# Altium footprint library Atlan.PcbLib: 283 footprints (part 13 of 18)
Each footprint in its own frame and in the unit in brackets; x right, y up, seen from the top. Pads: shape width x height; smd on the part's side, far side on the other; paste and mask are expansions set on the pad; w line width, h text height; cw(c..) or ccw(c..) is an arc to the next point about the centre after c.
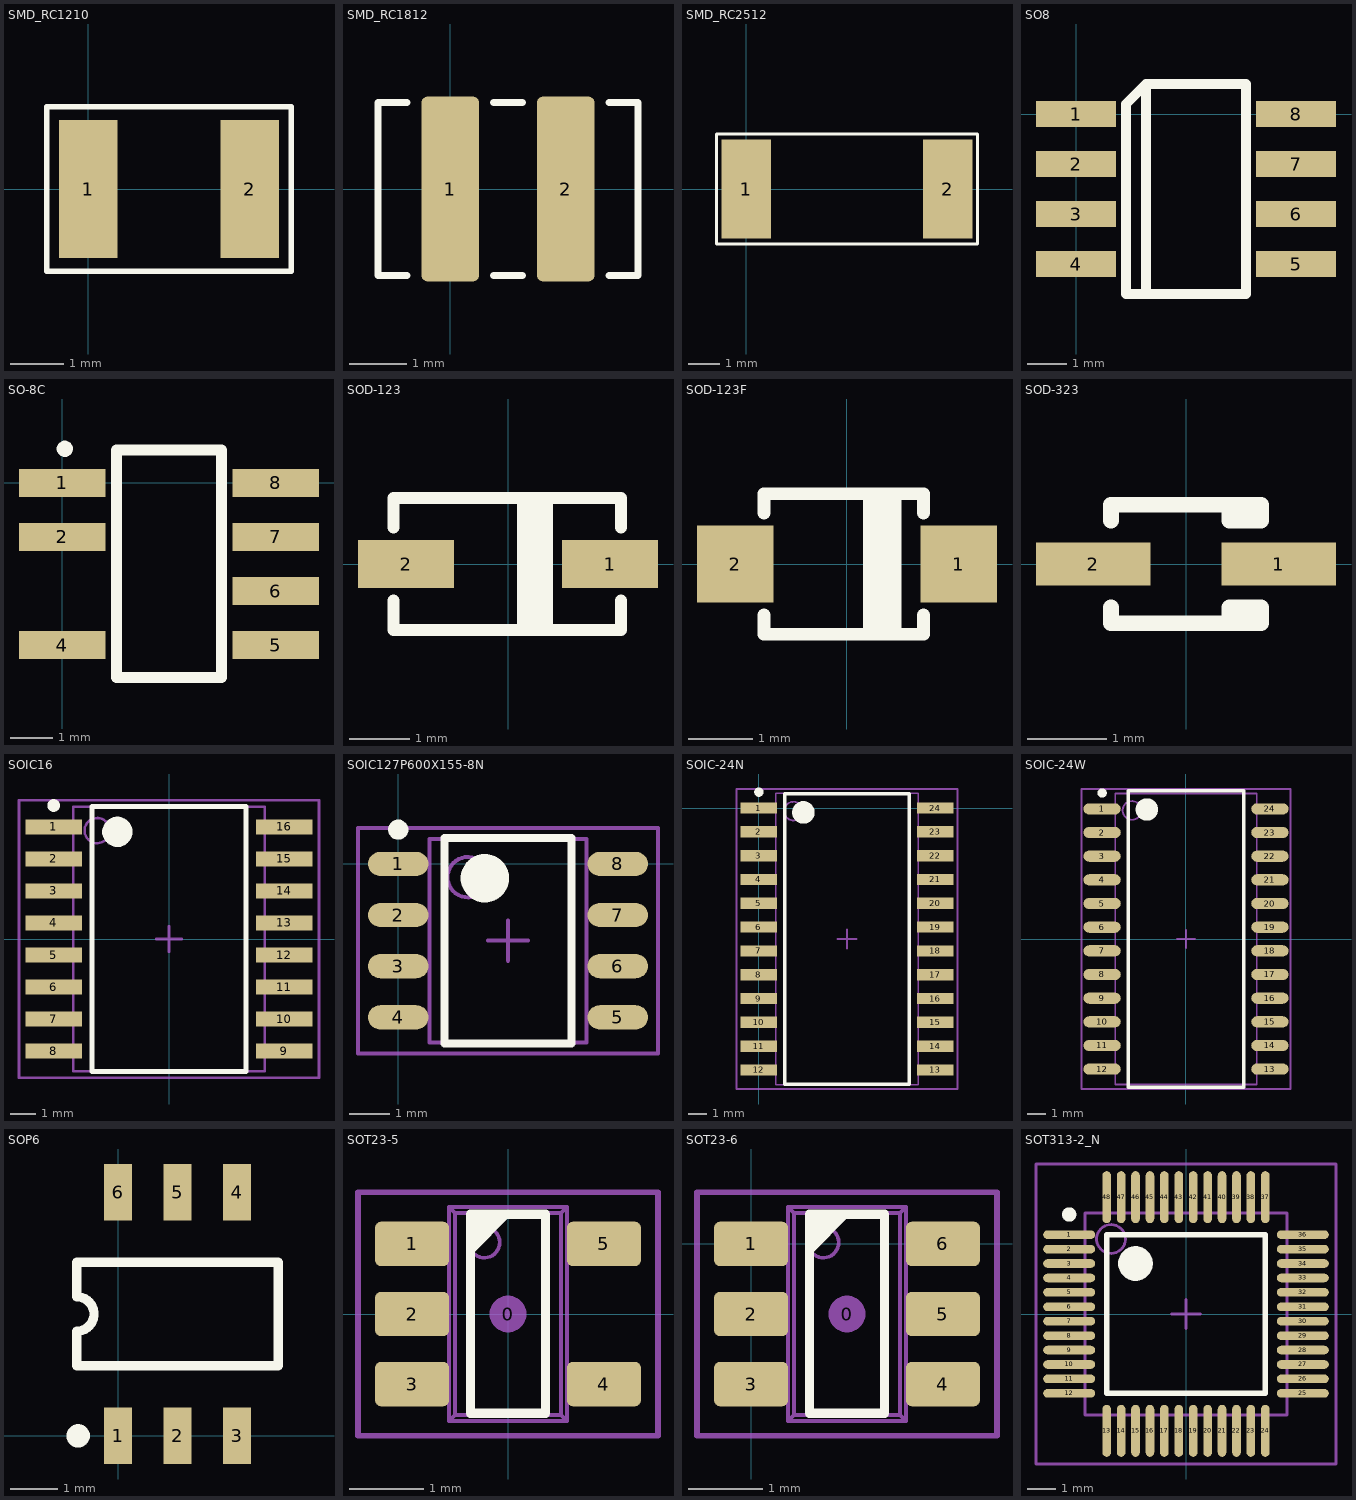
[diagram p12: the footprints below, top view; thin cyan lines are the x and y axes]

## SMD_RC1210 [mm]
pads (2):
  rect 1.1x2.6 smd: 1(0,0) 2(3.048,0)
Top Overlay:
  lines w0.1: -0.776,-1.55 -0.776,1.55 3.824,1.55 3.824,-1.55 -0.776,-1.55
3D body "CC 1210.STEP": height 1.78, standoff 0, extent 0,-1.275 3.048,1.265

## SMD_RC1812 [mm]
pads (2):
  rrect20% 1x3.2 smd: 1(0,0) 2(2,0)
Top Overlay:
  lines w0.12: -0.75,-1.5 -1.25,-1.5 -1.25,1.5 -0.75,1.5 ; 0.75,-1.5 1.25,-1.5 ; 0.75,1.5 1.25,1.5 ; 2.75,-1.5 3.25,-1.5 3.25,1.5 2.75,1.5
3D body: height 2.6, standoff 0, extent -1.25,-1.5 3.25,1.5

## SMD_RC2512 [mm]
pads (2):
  rect 1.6x3.2 smd: 1(0,0) 2(6.5,0)
Top Overlay:
  lines w0.1: -0.975,-1.775 7.475,-1.775 7.475,1.775 -0.975,1.775 -0.975,-1.775
3D body "User Library-RESC6432X06.STEP": height 0.6, standoff 0, extent 0.05,-1.6 6.45,1.6

## SO8 [mil]
pads (8):
  rect 80x26 smd: 1(0,0) 2(0,-50) 3(0,-100) 4(0,-150) 5(220,-150) 6(220,-100) 7(220,-50) 8(220,0)
Top Overlay:
  lines w10: 70,-180 70,30 ; 70,30 50,10 50,-180 170,-180 170,10 170,30 70,30
3D body "SO-8.step": height 64.96, standoff -0.98, extent -8.78,-171.26 229.25,21.65

## SO-8C [mil]
pads (7):
  rect 80x26 smd: 1(0,0) 2(0,-50) 4(0,-150) 5(197.36,-150) 6(197.36,-100) 7(197.36,-50) 8(197.36,0)
Top Overlay:
  lines w7.87: 5.77,32.47 ccw(c2.36,31.5) 5.91,31.5
  lines w10: 50.2,-180 147.36,-180 147.36,10 147.36,30.51 50.2,30.51 50.2,-180
3D body "SO-8.step": height 64.96, standoff -0.98, extent -21.65,-171.26 216.37,21.65

## SOD-123 [mm] "SOD-123; 2 Leads; Body 2.7 x 1.6 mm, (LxW)"
height 1.35
pads (2):
  rect 1.6x0.8 smd: 1(1.7,0) 2(-1.7,0)
Top Overlay:
  rectangle: 0.15,-1.1 0.75,1.1
  lines w0.2: -1.905,-0.61 -1.905,-1.1 1.88,-1.1 1.88,-0.61 ; -1.905,0.61 -1.905,1.1 1.88,1.1 1.88,0.61
3D body "sod123 v4.step": height 1.2, standoff 0, extent -1.875,-0.85 1.875,0.85

## SOD-123F [mm] "SOD-123; 2 Leads; Body 2.7 x 1.6 mm, (LxW)"
height 1.35
pads (2):
  rect 1.2x1.2 smd: 1(1.75,0) 2(-1.75,0)
Top Overlay:
  rectangle: 0.25,-1.1 0.85,1.1
  lines w0.2: -1.3,-0.8 -1.3,-1.1 1.2,-1.1 1.2,-0.8 ; -1.3,0.8 -1.3,1.1 1.2,1.1 1.2,0.8
3D body "sod123 v4.step": height 1.2, standoff 0, extent -1.875,-0.85 1.875,0.85

## SOD-323 [mm] "SOD-323/SC-76; 2 Leads; Body 1.7 x 1.3 mm, (LxW)"
height 1.1
pads (2):
  rect 1.45x0.55 smd: 1(1.175,0) 2(-1.175,0)
Top Overlay:
  lines w0.2: -0.95,-0.55 -0.95,-0.75 0.95,-0.75 0.95,-0.55 0.55,-0.55 0.55,-0.75 ; -0.95,0.55 -0.95,0.75 0.95,0.75 0.95,0.55 0.55,0.55 0.55,0.75
3D body "SOD-323.STEP": height 1.17, standoff 0.02, extent -1.35,-0.7 1.35,0.747

## SOIC16 [mm] "SOIC, 16-Leads, Body 10,5x7,6mm (max), Pitch 1,27mm, IPC Medium Density"
height 2.65
pads (16):
  rect 2.25x0.6 smd: 1(-4.575,4.445) 2(-4.575,3.175) 3(-4.575,1.905) 4(-4.575,0.635) 5(-4.575,-0.635) 6(-4.575,-1.905) 7(-4.575,-3.175) 8(-4.575,-4.445) 9(4.575,-4.445) 10(4.575,-3.175) 11(4.575,-1.905) 12(4.575,-0.635) 13(4.575,0.635) 14(4.575,1.905) 15(4.575,3.175) 16(4.575,4.445)
Top Overlay:
  circle w0.6: c-2.05,4.25 r0.3
  circle w0.25: c-4.575,5.295 r0.125
  lines w0.2: -3.05,-5.25 3.05,-5.25 3.05,5.25 -3.05,5.25 -3.05,-5.25
Mechanical 13:
  circle w0.1: c-2.85,4.3 r0.5
  lines w0.1: -3.8,-5.25 3.8,-5.25 3.8,5.25 -3.8,5.25 -3.8,-5.25
Mechanical 15:
  lines w0.1: -0.5,0 0.5,0 ; 0,-0.5 0,0.5 ; -5.95,-5.5 5.95,-5.5 5.95,5.5 -5.95,5.5 -5.95,-5.5
3D body: height 2.65, standoff 0.1, extent -3.8,-5.25 3.8,5.25

## SOIC127P600X155-8N [mm] "SOIC, 8-Leads, Body 5,1x3,9mm (max), Pitch 1,27mm, IPC Medium Density"
height 1.55
pads (8):
  oval 1.5x0.6 smd: 1(0,0) 2(0,-1.27) 3(0,-2.54) 4(0,-3.81) 5(5.45,-3.81) 6(5.45,-2.54) 7(5.45,-1.27) 8(5.45,0)
Top Overlay:
  circle w0.25: c0,0.85 r0.125
  circle w0.6: c2.15,-0.355 r0.3
  lines w0.2: 1.15,-4.455 1.15,0.645 4.3,0.645 4.3,-4.455 1.15,-4.455
Mechanical 13:
  circle w0.1: c1.725,-0.33 r0.5
  lines w0.1: 0.775,-4.43 0.775,0.62 4.675,0.62 4.675,-4.43 0.775,-4.43
Mechanical 15:
  lines w0.1: 2.225,-1.905 3.225,-1.905 ; 2.725,-2.405 2.725,-1.405 ; -1,-4.705 -1,0.895 6.45,0.895 6.45,-4.705 -1,-4.705
3D body: height 1.55, standoff 0.25, extent 0.775,-4.43 4.675,0.62

## SOIC-24N [mm] "SOIC, 24-Leads, Body 15,5x7,6mm (max), Pitch 1,27mm, IPC Medium Density"
height 2.65
pads (24):
  rect 1.95x0.6 smd: 1(0,0) 2(0,-1.27) 3(0,-2.54) 4(0,-3.81) 5(0,-5.08) 6(0,-6.35) 7(0,-7.62) 8(0,-8.89) 9(0,-10.16) 10(0,-11.43) 11(0,-12.7) 12(0,-13.97) 13(9.4,-13.97) 14(9.4,-12.7) 15(9.4,-11.43) 16(9.4,-10.16) 17(9.4,-8.89) 18(9.4,-7.62) 19(9.4,-6.35) 20(9.4,-5.08) 21(9.4,-3.81) 22(9.4,-2.54) 23(9.4,-1.27) 24(9.4,0)
Top Overlay:
  circle w0.25: c0,0.85 r0.125
  circle w0.6: c2.375,-0.235 r0.3
  lines w0.2: 1.375,-14.735 1.375,0.765 8.025,0.765 8.025,-14.735 1.375,-14.735
Mechanical 13:
  circle w0.1: c1.85,-0.165 r0.5
  lines w0.1: 0.9,-14.755 0.9,0.785 8.5,0.785 8.5,-14.755 0.9,-14.755
Mechanical 15:
  lines w0.1: 4.2,-6.985 5.2,-6.985 ; 4.7,-7.485 4.7,-6.485 ; -1.2,-14.985 -1.2,1.015 10.6,1.015 10.6,-14.985 -1.2,-14.985
3D body: height 2.65, standoff 0.23, extent 0.9,-14.755 8.5,0.785

## SOIC-24W [mm] "SOIC, 24-Leads, Body 15.4x7.5mm, Pitch 1.27mm, IPC High Density"
height 2.65
pads (24):
  oval 2x0.6 smd: 1(-4.5,6.985) 2(-4.5,5.715) 3(-4.5,4.445) 4(-4.5,3.175) 5(-4.5,1.905) 6(-4.5,0.635) 7(-4.5,-0.635) 8(-4.5,-1.905) 9(-4.5,-3.175) 10(-4.5,-4.445) 11(-4.5,-5.715) 12(-4.5,-6.985) 13(4.5,-6.985) 14(4.5,-5.715) 15(4.5,-4.445) 16(4.5,-3.175) 17(4.5,-1.905) 18(4.5,-0.635) 19(4.5,0.635) 20(4.5,1.905) 21(4.5,3.175) 22(4.5,4.445) 23(4.5,5.715) 24(4.5,6.985)
Top Overlay:
  circle w0.6: c-2.1,6.95 r0.3
  circle w0.25: c-4.5,7.835 r0.125
  lines w0.2: -3.1,-7.95 3.1,-7.95 3.1,7.95 -3.1,7.95 -3.1,-7.95
Mechanical 13:
  circle w0.1: c-2.9,6.9 r0.5
  lines w0.1: -3.8,-7.8 3.8,-7.8 3.8,7.8 -3.8,7.8 -3.8,-7.8
Mechanical 15:
  lines w0.1: -0.5,0 0.5,0 ; 0,-0.5 0,0.5 ; -5.6,-8.05 5.6,-8.05 5.6,8.05 -5.6,8.05 -5.6,-8.05
3D body "SOIC24 wide.stp": height 2, standoff 0, extent -5,-7.74 5.163,7.8

## SOP6 [mm]
pads (6):
  rect 0.6x1.2 smd: 1(0,0) 2(1.27,0) 3(2.54,0) 4(2.54,5.2) 5(1.27,5.2) 6(0,5.2)
Top Overlay:
  circle w0.25: c-0.85,0 r0.125
  lines w0.2: -0.88,1.5 -0.88,2.233 ccw(c-0.88,2.6) -0.88,2.967 -0.88,3.7 3.42,3.7 3.42,1.5 -0.88,1.5

## SOT23-5 [mm]
height 1.6
pads (6):
  round 0.5 on Mech15: 0(0,0)
  rrect25% 1x0.6 smd: 1(-1.3,0.95) 2(-1.3,0) 3(-1.3,-0.95) 4(1.3,-0.95) 5(1.3,0.95)
Top Overlay:
  region: -0.508,1.353 0.053,1.353 -0.508,0.792
  lines w0.127: -0.508,-1.347 -0.508,1.353 0.508,1.353 0.508,-1.347 -0.508,-1.347
  text "." at -2.275,0.95 h0.1
Mechanical 13:
  circle w0.05: c-0.32,0.97 r0.208
  lines w0.05: -1.191,-1.15 -1.191,-0.75 ; -1.191,-0.2 -1.191,0.2 ; -1.191,0.75 -1.191,1.15 ; -1.1,-1.15 -1.1,-0.75 ; -1.1,-0.2 -1.1,0.2 ; -1.1,0.75 -1.1,1.15 ; -1.094,-1.15 -1.094,-0.75 ; -1.094,-0.2 -1.094,0.2 ; -1.094,0.75 -1.094,1.15 ; -0.844,-1.15 -0.844,-0.75 ; -0.844,-0.2 -0.844,0.2 ; -0.844,0.75 -0.844,1.15 ; -0.8,-1.15 -1.4,-1.15 -1.4,-0.75 -0.8,-0.75 ; -0.8,-0.2 -1.4,-0.2 -1.4,0.2 -0.8,0.2 ; -0.8,0.75 -1.4,0.75 -1.4,1.15 -0.8,1.15 ; 0.8,-1.15 1.4,-1.15 1.4,-0.75 0.8,-0.75 ; 0.8,0.75 1.4,0.75 1.4,1.15 0.8,1.15 ; 0.844,-1.15 0.844,-0.75 ; 0.844,0.75 0.844,1.15 ; 1.094,-1.15 1.094,-0.75 ; 1.094,0.75 1.094,1.15 ; 1.1,-1.15 1.1,-0.75 ; 1.1,0.75 1.1,1.15 ; 1.191,-1.15 1.191,-0.75 ; 1.191,0.75 1.191,1.15 ; -0.8,-1.45 -0.8,1.45 ; -0.8,-1.45 -0.719,-1.369 ; -0.8,-1.45 0.8,-1.45 ; -0.8,1.45 -0.719,1.369 ; -0.8,1.45 0.8,1.45 ; -0.719,-1.369 0.719,-1.369 ; -0.719,-1.369 -0.719,1.369 ; -0.719,1.369 0.719,1.369 ; 0.719,-1.369 0.8,-1.45 ; 0.719,-1.369 0.719,1.369 ; 0.719,1.369 0.8,1.45 ; 0.8,-1.45 0.8,1.45
Mechanical 15:
  lines w0.076: -2.032,-1.651 -2.032,1.651 2.032,1.651 2.032,-1.651 -2.032,-1.651
3D body "SOT23-5.STEP": height 1.44, standoff -0.01, extent -1.4,-1.45 1.4,1.45

## SOT23-6 [mm]
height 1.6
pads (7):
  round 0.5 on Mech15: 0(1.3,-0.95)
  rrect25% 1x0.6 smd: 1(0,0) 2(0,-0.95) 3(0,-1.9) 4(2.6,-1.9) 5(2.6,-0.95) 6(2.6,0)
Top Overlay:
  region: 0.792,0.403 1.353,0.403 0.792,-0.158
  lines w0.127: 0.792,-2.297 0.792,0.403 1.808,0.403 1.808,-2.297 0.792,-2.297
  text "." at -0.975,0 h0.1
Mechanical 13:
  circle w0.05: c0.98,0.02 r0.208
  lines w0.05: 0.109,-2.1 0.109,-1.7 ; 0.109,-1.15 0.109,-0.75 ; 0.109,-0.2 0.109,0.2 ; 0.2,-2.1 0.2,-1.7 ; 0.2,-1.15 0.2,-0.75 ; 0.2,-0.2 0.2,0.2 ; 0.206,-2.1 0.206,-1.7 ; 0.206,-1.15 0.206,-0.75 ; 0.206,-0.2 0.206,0.2 ; 0.456,-2.1 0.456,-1.7 ; 0.456,-1.15 0.456,-0.75 ; 0.456,-0.2 0.456,0.2 ; 0.5,-2.1 -0.1,-2.1 -0.1,-1.7 0.5,-1.7 ; 0.5,-1.15 -0.1,-1.15 -0.1,-0.75 0.5,-0.75 ; 0.5,-0.2 -0.1,-0.2 -0.1,0.2 0.5,0.2 ; 2.1,-2.1 2.7,-2.1 2.7,-1.7 2.1,-1.7 ; 2.1,-1.15 2.7,-1.15 2.7,-0.75 2.1,-0.75 ; 2.1,-0.2 2.7,-0.2 2.7,0.2 2.1,0.2 ; 2.144,-2.1 2.144,-1.7 ; 2.144,-1.15 2.144,-0.75 ; 2.144,-0.2 2.144,0.2 ; 2.394,-2.1 2.394,-1.7 ; 2.394,-1.15 2.394,-0.75 ; 2.394,-0.2 2.394,0.2 ; 2.4,-2.1 2.4,-1.7 ; 2.4,-1.15 2.4,-0.75 ; 2.4,-0.2 2.4,0.2 ; 2.491,-2.1 2.491,-1.7 ; 2.491,-1.15 2.491,-0.75 ; 2.491,-0.2 2.491,0.2 ; 0.5,-2.4 2.1,-2.4 ; 0.5,-2.4 0.581,-2.319 ; 0.5,-2.4 0.5,0.5 ; 0.5,0.5 2.1,0.5 ; 0.5,0.5 0.581,0.419 ; 0.581,-2.319 0.581,0.419 ; 0.581,-2.319 2.019,-2.319 ; 0.581,0.419 2.019,0.419 ; 2.019,-2.319 2.019,0.419 ; 2.019,-2.319 2.1,-2.4 ; 2.019,0.419 2.1,0.5 ; 2.1,-2.4 2.1,0.5
Mechanical 15:
  lines w0.076: -0.732,-2.601 -0.732,0.701 3.332,0.701 3.332,-2.601 -0.732,-2.601
3D body "SOT23-6.STEP": height 1.44, standoff -0.01, extent -0.1,-2.4 2.7,0.5

## SOT313-2_N [mm] "Thin QFP, 48-Leads, Body 7x7mm, Pitch 0.5mm, IPC Medium Density"
height 1.6
pads (48):
  oval 1.8x0.3 smd: 1(-4.05,2.75) 2(-4.05,2.25) 3(-4.05,1.75) 4(-4.05,1.25) 5(-4.05,0.75) 6(-4.05,0.25) 7(-4.05,-0.25) 8(-4.05,-0.75) 9(-4.05,-1.25) 10(-4.05,-1.75) 11(-4.05,-2.25) 12(-4.05,-2.75) 25(4.05,-2.75) 26(4.05,-2.25) 27(4.05,-1.75) 28(4.05,-1.25) 29(4.05,-0.75) 30(4.05,-0.25) 31(4.05,0.25) 32(4.05,0.75) 33(4.05,1.25) 34(4.05,1.75) 35(4.05,2.25) 36(4.05,2.75)
  oval 0.3x1.8 smd: 13(-2.75,-4.05) 14(-2.25,-4.05) 15(-1.75,-4.05) 16(-1.25,-4.05) 17(-0.75,-4.05) 18(-0.25,-4.05) 19(0.25,-4.05) 20(0.75,-4.05) 21(1.25,-4.05) 22(1.75,-4.05) 23(2.25,-4.05) 24(2.75,-4.05) 37(2.75,4.05) 38(2.25,4.05) 39(1.75,4.05) 40(1.25,4.05) 41(0.75,4.05) 42(0.25,4.05) 43(-0.25,4.05) 44(-0.75,4.05) 45(-1.25,4.05) 46(-1.75,4.05) 47(-2.25,4.05) 48(-2.75,4.05)
Top Overlay:
  circle w0.25: c-4.05,3.45 r0.125
  circle w0.6: c-1.75,1.75 r0.3
  lines w0.2: -2.75,-2.75 -2.75,2.75 2.75,2.75 2.75,-2.75 -2.75,-2.75
Mechanical 13:
  circle w0.1: c-2.6,2.6 r0.5
  lines w0.1: -3.5,-3.5 -3.5,3.5 3.5,3.5 3.5,-3.5 -3.5,-3.5
Mechanical 15:
  lines w0.1: -0.5,0 0.5,0 ; 0,-0.5 0,0.5 ; -5.2,-5.2 -5.2,5.2 5.2,5.2 5.2,-5.2 -5.2,-5.2
3D body: height 1.6, standoff 0, extent -3.5,-3.5 3.5,3.5